# Altium footprint library Amirreza.PcbLib: 524 footprints (part 8 of 33)
Each footprint in its own frame and in the unit in brackets; x right, y up, seen from the top. Pads: shape width x height; smd on the part's side, far side on the other; paste and mask are expansions set on the pad; w line width, h text height; cw(c..) or ccw(c..) is an arc to the next point about the centre after c.
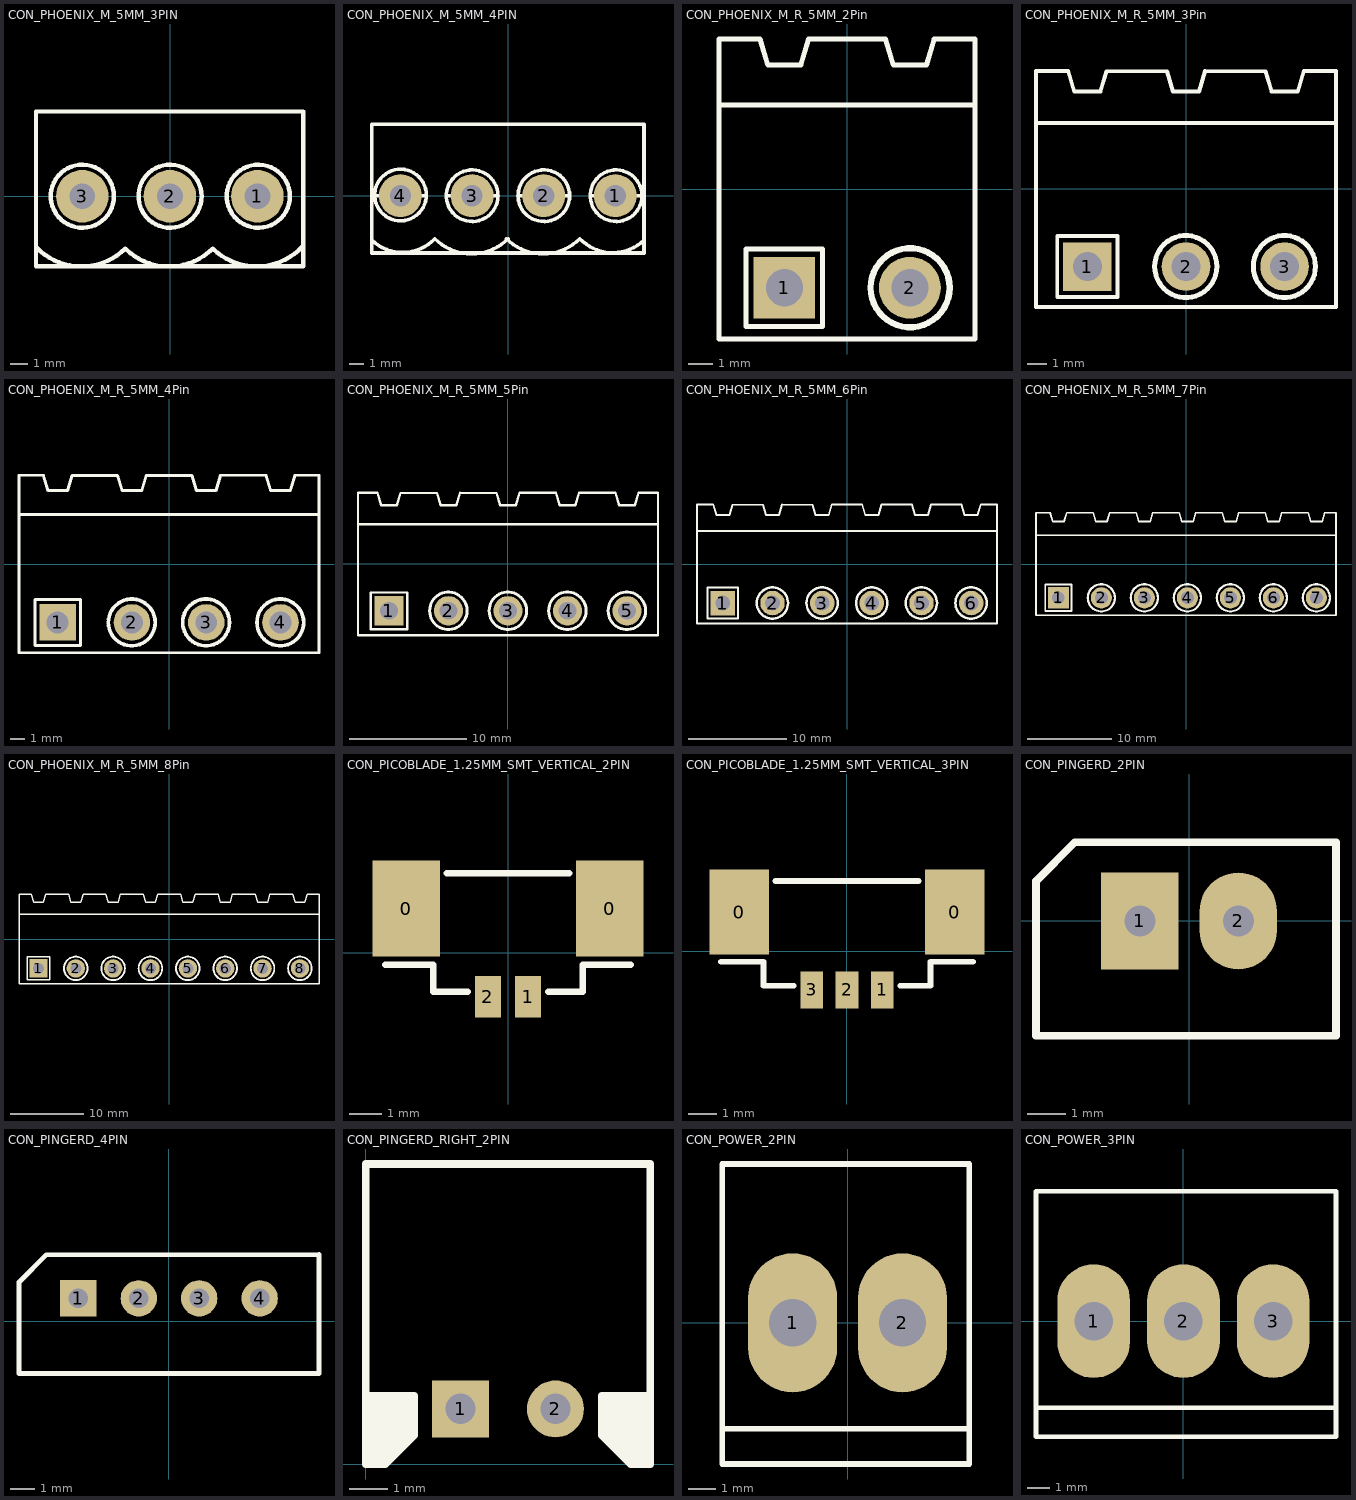
[diagram p7: the footprints below, top view; thin cyan lines are the x and y axes]

## CON_PHOENIX_M_5MM_3PIN [mil]
pads (3):
  round 120 hole 59.06: 1(198.63,0) 2(-1.37,0) 3(-201.37,0)
Top Overlay:
  circle w10: c200.74,0 r72.11
  circle w10: c-201.26,0 r72.11
  circle w10: c-0.91,0 r72.11
  lines w10: -307.09,193.64 -307.09,-160 -121.37,-160 303,-160 303,193.64 -307,193.64 ; -306.22,-116.82 ccw(c-203.36,-18.01) -103.35,-119.71 ; -103.06,-120 ccw(c-3.36,-18.01) 96.65,-119.71 ; 96.94,-120 ccw(c196.64,-18.01) 302.09,-114.05
3D body "1758021.stp": height 473.44, standoff -152.54, extent -302,-150 298,188.58

## CON_PHOENIX_M_5MM_4PIN [mil]
pads (4):
  round 120 hole 59.06: 1(299.65,0) 2(99.65,0) 3(-100.35,0) 4(-300.35,0)
Top Overlay:
  circle w10: c-300.24,2 r72.11
  circle w10: c301.76,0 r72.11
  circle w10: c-100.24,0 r72.11
  circle w10: c100.11,0 r72.11
  lines w10: -380.35,-124.09 ccw(c-294.44,-34.09) -204.44,-120 ccw(c-101.94,-17.5) 0.56,-120 ; -371.12,0 -231.12,0 ; -167.12,0 -27.12,0 ; -4.44,-120 ccw(c98.06,-17.5) 200.56,-120 ccw(c292.15,-32.5) 379.65,-124.09 ; 28,0 168,0 ; 230.52,0 370.52,0 ; -380.35,-160 -180.35,-160 -20.35,-160 379.65,-160 379.65,200 -20.35,200 -180.35,200 -380.35,200 -380.35,-160

## CON_PHOENIX_M_R_5MM_2Pin [mm]
pads (2):
  rect 2.5x2.5 / inner rect 2.5x2.5 / far side rect 3.2x3.2 hole 1.5: 1(-2.536,-3.995)
  round 2.5 / inner round 2.5 / far side round 3.2 hole 1.5: 2(2.544,-3.995)
Top Overlay:
  circle w0.254: c2.555,-3.995 r1.6
  lines w0.2: -5.152,3.397 5.16,3.397 ; -5.182,-6.07 5.182,-6.07 5.182,6.07 3.528,6.07 3.213,5.014 1.875,5.014 1.562,6.063 -1.555,6.063 -1.867,5.014 -3.205,5.014 -3.52,6.07 -5.182,6.07 -5.182,-6.07 ; -4.086,-5.563 -0.987,-5.563 -0.987,-2.427 -4.086,-2.427 -4.086,-5.563
3D body "70054618.stp": height 8.6, standoff -3.5, extent -5.076,-5.932 5.084,6.07
3D body "1757019.stp": height 15.17, standoff 0.17, extent -5.076,-2.071 5.084,16.129

## CON_PHOENIX_M_R_5MM_3Pin [mm]
pads (3):
  rect 2.5x2.5 / inner rect 2.5x2.5 / far side rect 3.2x3.2 hole 1.5: 1(-5.08,-3.995)
  round 2.5 / inner round 2.5 / far side round 3.2 hole 1.5: 2(0,-3.995) 3(5.08,-3.995)
Top Overlay:
  circle w0.254: c-0.012,-3.995 r1.6
  circle w0.254: c5.068,-3.995 r1.6
  lines w0.2: -7.696,3.397 7.725,3.397 ; 0.984,6.063 4.098,6.063 4.411,5.014 5.749,5.014 6.064,6.07 7.725,6.07 7.725,-6.07 -7.725,-6.07 -7.725,6.07 -6.064,6.07 -5.749,5.014 -4.411,5.014 -4.098,6.063 -0.982,6.063 -0.669,5.014 0.669,5.014 0.984,6.07 ; -6.629,-5.563 -6.629,-2.427 -3.531,-2.427 -3.531,-5.563 -6.629,-5.563
3D body "1757022.stp": height 15.17, standoff 0.17, extent -7.569,-2.388 7.671,15.812
3D body "pxc_1754452_04_MSTB-2-5-3-G_3D.stp": height 8.57, standoff -3.5, extent -7.5,-6.07 7.5,5.93

## CON_PHOENIX_M_R_5MM_4Pin [mm]
pads (4):
  rect 2.5x2.5 / inner rect 2.5x2.5 / far side rect 3.2x3.2 hole 1.5: 1(-7.614,-3.995)
  round 2.5 / inner round 2.5 / far side round 3.2 hole 1.5: 2(-2.534,-3.995) 3(2.546,-3.995) 4(7.626,-3.995)
Top Overlay:
  circle w0.254: c-2.546,-3.995 r1.6
  circle w0.254: c2.534,-3.995 r1.6
  circle w0.254: c7.614,-3.995 r1.6
  lines w0.2: -10.26,3.397 10.245,3.397 ; -1.55,6.063 1.564,6.063 1.877,5.014 3.215,5.014 3.53,6.07 6.644,6.07 ; -1.55,6.07 -1.865,5.014 -3.203,5.014 -3.516,6.063 -6.633,6.063 -6.945,5.014 -8.283,5.014 -8.598,6.07 -10.26,6.07 -10.26,-6.07 10.245,-6.07 ; 6.644,6.063 6.957,5.014 8.295,5.014 8.61,6.07 10.26,6.07 10.26,-6.07 ; -9.164,-5.563 -9.164,-2.427 -6.065,-2.427 -6.065,-5.563 -9.164,-5.563
3D body "1757035.stp": height 15.17, standoff 0.17, extent -10.062,-2.388 10.258,15.812
3D body "pxc_1759033_04_MSTB-2-5-4-G-5-08_3D.stp": height 8.57, standoff -3.5, extent -10.034,-6.07 10.286,5.93

## CON_PHOENIX_M_R_5MM_5Pin [mm]
pads (5):
  rect 2.5x2.5 / inner rect 2.5x2.5 / far side rect 3.2x3.2 hole 1.5: 1(-10.16,-3.995)
  round 2.5 / inner round 2.5 / far side round 3.2 hole 1.5: 2(-5.08,-3.995) 3(0,-3.995) 4(5.08,-3.995) 5(10.16,-3.995)
Top Overlay:
  circle w0.254: c5.068,-3.995 r1.6
  circle w0.254: c-0.012,-3.995 r1.6
  circle w0.254: c-5.092,-3.995 r1.6
  circle w0.254: c10.148,-3.995 r1.6
  lines w0.2: -12.776,3.397 12.805,3.397 ; -4.096,6.063 -0.982,6.063 -0.669,5.014 0.669,5.014 0.984,6.07 4.098,6.07 ; -4.096,6.07 -4.411,5.014 -5.749,5.014 -6.062,6.063 -9.178,6.063 -9.491,5.014 -10.829,5.014 -11.144,6.07 -12.805,6.07 -12.805,-6.07 12.805,-6.07 12.805,6.07 11.144,6.07 10.829,5.014 9.491,5.014 9.178,6.063 ; 4.098,6.063 4.411,5.014 5.749,5.014 6.064,6.07 9.178,6.07 ; -11.709,-5.563 -8.611,-5.563 -8.611,-2.427 -11.709,-2.427 -11.709,-5.563
3D body "pxc_1757048_07_02_MSTB-2-5-5-ST-5-08_3D.stp": height 15.3, standoff 0.3, extent -12.608,-2.388 12.852,15.912
3D body "pxc_1759046_04_MSTB-2-5-5-G-5-08_3D.stp": height 8.57, standoff -3.5, extent -12.58,-6.07 12.82,5.93

## CON_PHOENIX_M_R_5MM_6Pin [mm]
pads (6):
  rect 2.5x2.5 / inner rect 2.5x2.5 / far side rect 3.2x3.2 hole 1.5: 1(-12.7,-3.995)
  round 2.5 / inner round 2.5 / far side round 3.2 hole 1.5: 2(-7.62,-3.995) 3(-2.54,-3.995) 4(2.54,-3.995) 5(7.62,-3.995) 6(12.7,-3.995)
Top Overlay:
  circle w0.254: c7.608,-3.995 r1.6
  circle w0.254: c-7.632,-3.995 r1.6
  circle w0.254: c-2.552,-3.995 r1.6
  circle w0.254: c2.528,-3.995 r1.6
  circle w0.254: c12.688,-3.995 r1.6
  lines w0.2: -15.316,3.397 15.345,3.397 ; -6.636,6.063 -3.522,6.063 -3.209,5.014 -1.871,5.014 -1.556,6.07 1.558,6.07 ; -6.636,6.07 -6.951,5.014 -8.289,5.014 -8.602,6.063 -11.718,6.063 -12.031,5.014 -13.369,5.014 -13.684,6.07 -15.345,6.07 -15.345,-6.07 15.345,-6.07 15.345,6.07 13.684,6.07 13.369,5.014 12.031,5.014 11.718,6.063 ; 1.558,6.063 1.871,5.014 3.209,5.014 3.524,6.07 6.638,6.07 ; 6.638,6.063 6.951,5.014 8.289,5.014 8.604,6.07 11.718,6.07 ; -14.249,-5.563 -14.249,-2.427 -11.151,-2.427 -11.151,-5.563 -14.249,-5.563
3D body "pxc_1759059_04_MSTB-2-5-6-G-5-08_3D.stp": height 8.57, standoff -3.5, extent -15.12,-6.07 15.36,5.93
3D body "pxc_1757051_06_MSTB-2-5-6-ST-5-08_3D.stp": height 15, standoff 0, extent -15.12,-2.26 15.42,16.04

## CON_PHOENIX_M_R_5MM_7Pin [mm]
pads (7):
  rect 2.5x2.5 / inner rect 2.5x2.5 / far side rect 3.2x3.2 hole 1.5: 1(-15.073,-3.995)
  round 2.5 / inner round 2.5 / far side round 3.2 hole 1.5: 2(-9.993,-3.995) 3(-4.913,-3.995) 4(0.167,-3.995) 5(5.247,-3.995) 6(10.327,-3.995) 7(15.407,-3.995)
Top Overlay:
  circle w0.254: c15.395,-3.995 r1.6
  circle w0.254: c5.235,-3.995 r1.6
  circle w0.254: c-10.005,-3.995 r1.6
  circle w0.254: c-4.925,-3.995 r1.6
  circle w0.254: c0.155,-3.995 r1.6
  circle w0.254: c10.315,-3.995 r1.6
  lines w0.2: -17.689,3.397 17.718,3.397 ; -9.009,6.063 -5.895,6.063 -5.582,5.014 -4.244,5.014 -3.929,6.07 -0.815,6.07 ; -9.009,6.07 -9.324,5.014 -10.662,5.014 -10.975,6.063 -14.091,6.063 -14.404,5.014 -15.742,5.014 -16.057,6.07 -17.718,6.07 -17.718,-6.07 17.718,-6.07 17.718,6.07 16.391,6.07 16.076,5.014 14.738,5.014 14.425,6.063 ; -0.815,6.063 -0.502,5.014 0.836,5.014 1.151,6.07 4.265,6.07 ; 4.265,6.063 4.578,5.014 5.916,5.014 6.231,6.07 9.345,6.07 ; 9.345,6.063 9.658,5.014 10.996,5.014 11.311,6.07 14.425,6.07 ; -16.622,-5.563 -16.622,-2.427 -13.524,-2.427 -13.524,-5.563 -16.622,-5.563
3D body "pxc_1754546_05_MSTB-2-5-7-ST_3D.stp": height 15.1, standoff 0.1, extent -17.493,-2.26 17.507,15.94
3D body "pxc_1754533_04_MSTB-2-5-7-G_3D.stp": height 8.57, standoff -3.5, extent -17.493,-6.07 17.507,5.93

## CON_PHOENIX_M_R_5MM_8Pin [mm]
pads (8):
  rect 2.5x2.5 / inner rect 2.5x2.5 / far side rect 3.2x3.2 hole 1.5: 1(-17.751,-3.995)
  round 2.5 / inner round 2.5 / far side round 3.2 hole 1.5: 2(-12.671,-3.995) 3(-7.591,-3.995) 4(-2.511,-3.995) 5(2.569,-3.995) 6(7.649,-3.995) 7(12.729,-3.995) 8(17.809,-3.995)
Top Overlay:
  circle w0.254: c12.718,-3.995 r1.6
  circle w0.254: c2.558,-3.995 r1.6
  circle w0.254: c-12.682,-3.995 r1.6
  circle w0.254: c-7.602,-3.995 r1.6
  circle w0.254: c-2.522,-3.995 r1.6
  circle w0.254: c7.638,-3.995 r1.6
  circle w0.254: c17.798,-3.995 r1.6
  lines w0.2: -20.367,3.397 20.396,3.397 ; -11.687,6.063 -8.572,6.063 -8.26,5.014 -6.922,5.014 -6.607,6.07 -3.492,6.07 ; -11.687,6.07 -12.002,5.014 -13.34,5.014 -13.652,6.063 -16.769,6.063 -17.082,5.014 -18.42,5.014 -18.735,6.07 -20.396,6.07 -20.396,-6.07 20.396,-6.07 20.396,6.07 18.793,6.07 18.478,5.014 17.14,5.014 16.828,6.063 ; -3.492,6.063 -3.18,5.014 -1.842,5.014 -1.527,6.07 1.588,6.07 ; 1.588,6.063 1.9,5.014 3.238,5.014 3.553,6.07 6.668,6.07 ; 6.668,6.063 6.98,5.014 8.318,5.014 8.633,6.07 11.748,6.07 ; 11.748,6.063 12.06,5.014 13.398,5.014 13.713,6.07 16.828,6.07 ; -19.3,-5.563 -19.3,-2.427 -16.201,-2.427 -16.201,-5.563 -19.3,-5.563
3D body "pxc_1754562_05_01_MSTB-2-5-8-ST_3D.stp": height 15, standoff 0, extent -20.171,-2.26 19.889,16.04
3D body "pxc_1759075_04_MSTB-2-5-8-G-5-08_3D.stp": height 8.57, standoff -3.5, extent -20.269,-6.044 20.371,5.956

## CON_PICOBLADE_1.25MM_SMT_VERTICAL_2PIN [mm]
pads (4):
  rect 2.1x3 smd: 0(-3.175,1.375) 0(3.175,1.375)
  rect 0.8x1.3 smd: 1(0.625,-1.375) 2(-0.625,-1.375)
Top Overlay:
  lines w0.203: -3.825,-0.376 -2.325,-0.376 -2.325,-1.225 -1.26,-1.225 ; -1.905,2.475 1.905,2.475 ; 1.26,-1.225 2.325,-1.225 2.325,-0.376 3.825,-0.376
3D body "User Library-molex 53398.step": height 4.73, standoff 0.03, extent -3.825,-1.711 3.825,2.489

## CON_PICOBLADE_1.25MM_SMT_VERTICAL_3PIN [mm]
pads (5):
  rect 2.1x3 smd: 0(-3.8,1.375) 0(3.8,1.375)
  rect 0.8x1.3 smd: 1(1.25,-1.375) 2(0,-1.375) 3(-1.25,-1.375)
Top Overlay:
  lines w0.203: -4.45,-0.376 -2.95,-0.376 -2.95,-1.225 -1.885,-1.225 ; -2.53,2.475 2.53,2.475 ; 1.885,-1.225 2.95,-1.225 2.95,-0.376 4.45,-0.376
3D body "53398-0371.step": height 4.71, standoff -0.04, extent -4.45,-1.711 4.45,2.489

## CON_PINGERD_2PIN [mm]
pads (2):
  rect 2x2.5 hole 0.8: 1(-1.27,0)
  oval 2x2.5 hole 0.8: 2(1.27,0)
Top Overlay:
  lines w0.2: -3.954,-2.968 -3.954,1.028 -2.95,2.032 3.793,2.032 3.793,-2.968 -3.954,-2.968
3D body "22-03-5025.stp": height 5.92, standoff -3.48, extent -3.7,-3.07 3.7,1.83

## CON_PINGERD_4PIN [mm]
pads (4):
  rect 1.5x1.5 / inner rect 1.5x1.5 / far side rect 2x2 hole 0.8: 1(-3.748,0.941)
  round 1.5 / inner round 1.5 / far side round 2 hole 0.8: 2(-1.248,0.941) 3(1.252,0.941) 4(3.752,0.941)
Top Overlay:
  lines w0.2: -6.198,-2.159 6.202,-2.159 ; -6.198,-2.154 -6.198,1.609 -5.066,2.741 6.202,2.741 ; 6.202,-2.154 6.202,2.746
3D body "022035045.stp": height 5.95, standoff -3.45, extent -6.203,-2.154 6.197,2.746

## CON_PINGERD_RIGHT_2PIN [mm] "A2506WR-2P"
pads (2):
  rect 1.5x1.5 / inner rect 1.5x1.5 / far side rect 1.8x1.8 hole 0.8: 1(2.5,1.45)
  round 1.5 / inner round 1.5 / far side round 1.8 hole 0.8: 2(5,1.45)
Top Overlay:
  region: 7.5,1.8 6.223,1.8 6.223,0.762 6.985,0 7.5,0
  region: 0,1.8 1.277,1.8 1.277,0.762 0.515,0 0,0
  lines w0.2: 0,1.8 1.277,1.8 1.277,0.762 0.515,0 0,0 0,7.9 7.5,7.9 7.5,0 6.985,0 6.223,0.762 6.223,1.8 7.5,1.8
3D body "x2564wr-02-n0sn.stp": height 5.05, standoff -3.35, extent 0,0 7.5,7.9

## CON_POWER_2PIN [mm]
pads (2):
  oval 3.2x5 hole 1.7: 1(-1.975,0) 2(1.975,0)
Top Overlay:
  lines w0.203: -4.515,-3.81 4.375,-3.81 ; -4.515,-5.08 4.375,-5.08 4.375,5.715 -4.515,5.715 -4.515,-5.08
3D body "User Library-Cvilux_CI5102P1V00.STEP": height 13.9, standoff -3.6, extent -3.959,-4.98 3.961,4.62

## CON_POWER_3PIN [mm]
pads (3):
  oval 3.2x5 hole 1.7: 1(-3.95,0) 2(0,0) 3(3.95,0)
Top Overlay:
  lines w0.203: -6.49,-3.81 6.718,-3.81 ; -6.49,-5.08 -6.49,5.715 6.718,5.715 6.718,-5.08 -6.49,-5.08
3D body "User Library-Cvilux_CI5103P1V00.STEP": height 13.9, standoff -3.6, extent -5.938,-4.98 5.942,4.62